# Altium footprint library 4.49-接插件.PcbLib: 260 footprints (part 8 of 17)
Each footprint in its own frame and in the unit in brackets; x right, y up, seen from the top. Pads: shape width x height; smd on the part's side, far side on the other; paste and mask are expansions set on the pad; w line width, h text height; cw(c..) or ccw(c..) is an arc to the next point about the centre after c.
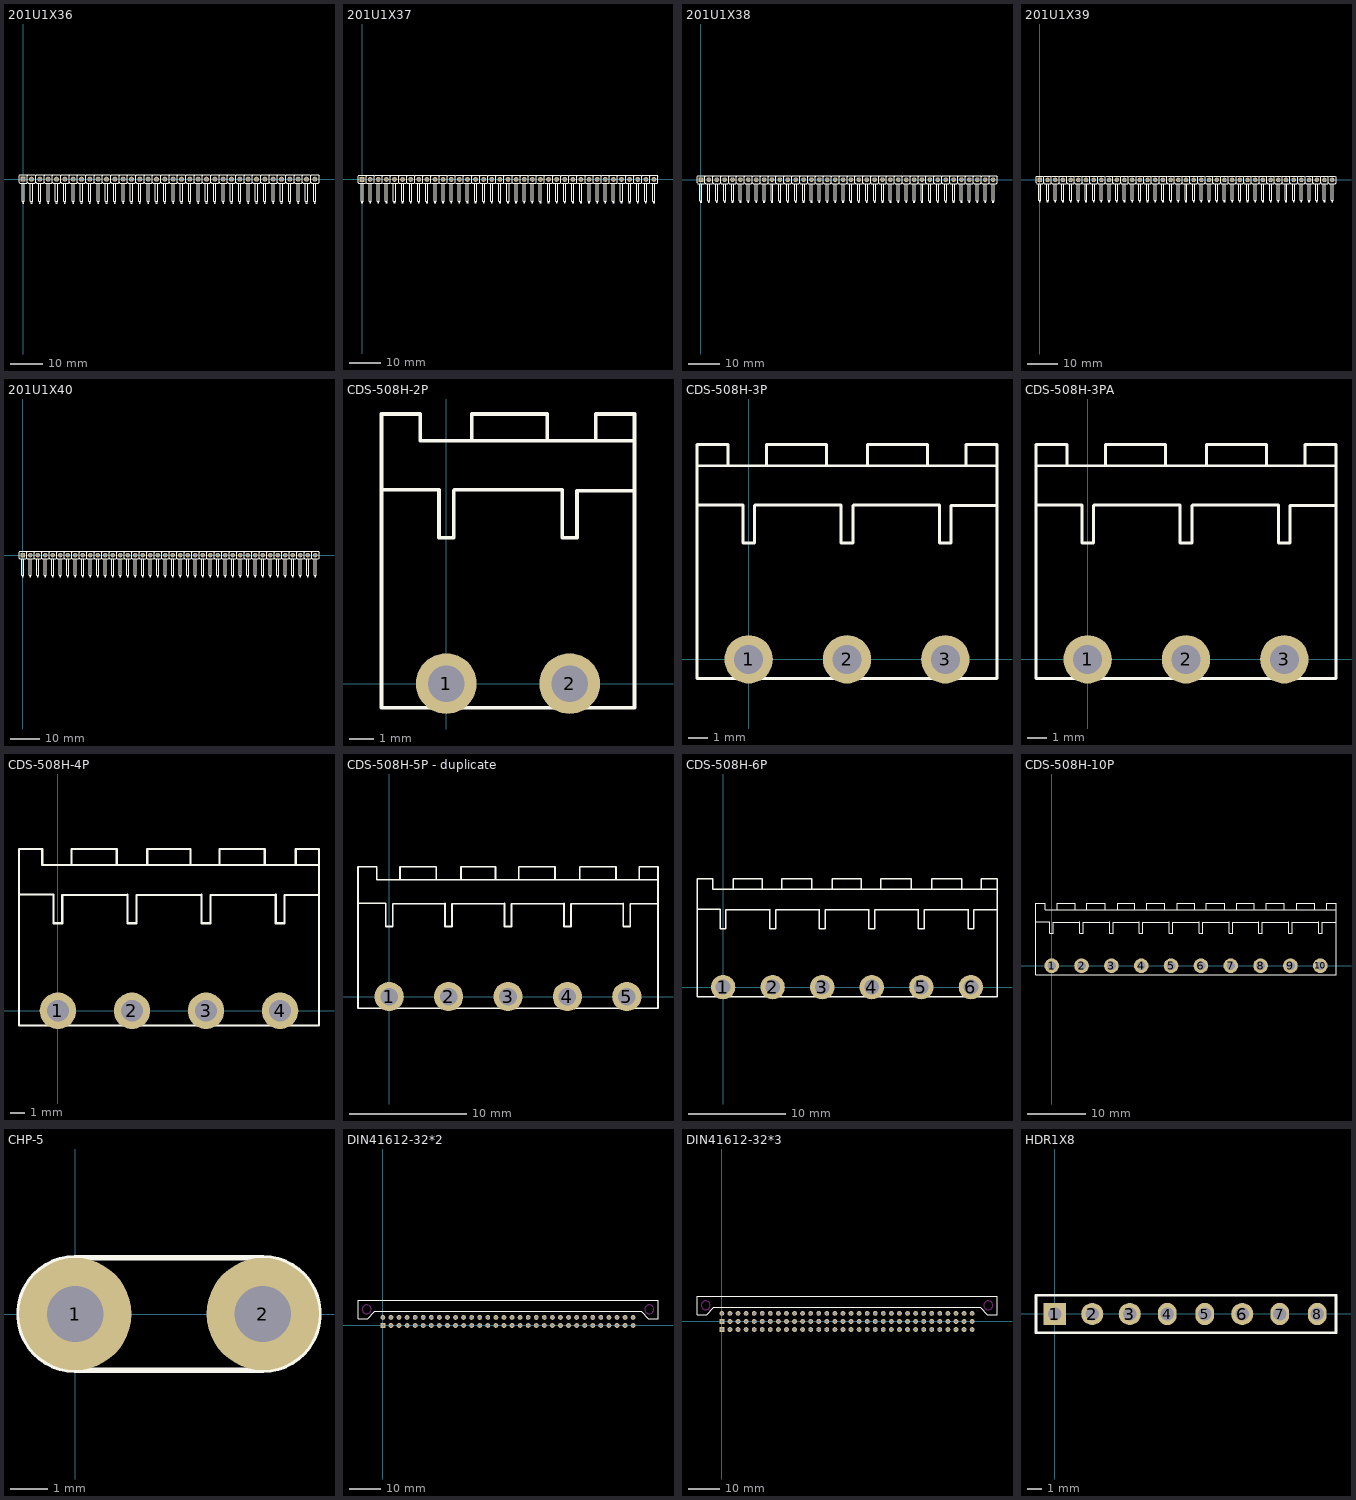
[diagram p7: the footprints below, top view; thin cyan lines are the x and y axes]

## 201U1X36 [mm]
pads (36):
  rect 1.5x1.5 hole 1: 1(0,0)
  round 1.5 hole 1: 2(2.54,0) 3(5.08,0) 4(7.62,0) 5(10.16,0) 6(12.7,0) 7(15.24,0) 8(17.78,0) 9(20.32,0) 10(22.86,0) 11(25.4,0) 12(27.94,0) 13(30.48,0) 14(33.02,0) 15(35.56,0) 16(38.1,0) 17(40.64,0) 18(43.18,0) 19(45.72,0) 20(48.26,0) 21(50.8,0) 22(53.34,0) 23(55.88,0) 24(58.42,0) 25(60.96,0) 26(63.5,0) 27(66.04,0) 28(68.58,0) 29(71.12,0) 30(73.66,0) 31(76.2,0) 32(78.74,0) 33(81.28,0) 34(83.82,0) 35(86.36,0) 36(88.9,0)
Top Overlay:
  drawing of 469 lines, arcs and shapes, not listed
3D body: height 5.12, standoff -3, extent -1.27,-7.27 90.17,1.27

## 201U1X37 [mm]
pads (37):
  rect 1.5x1.5 hole 1: 1(0,0)
  round 1.5 hole 1: 2(2.54,0) 3(5.08,0) 4(7.62,0) 5(10.16,0) 6(12.7,0) 7(15.24,0) 8(17.78,0) 9(20.32,0) 10(22.86,0) 11(25.4,0) 12(27.94,0) 13(30.48,0) 14(33.02,0) 15(35.56,0) 16(38.1,0) 17(40.64,0) 18(43.18,0) 19(45.72,0) 20(48.26,0) 21(50.8,0) 22(53.34,0) 23(55.88,0) 24(58.42,0) 25(60.96,0) 26(63.5,0) 27(66.04,0) 28(68.58,0) 29(71.12,0) 30(73.66,0) 31(76.2,0) 32(78.74,0) 33(81.28,0) 34(83.82,0) 35(86.36,0) 36(88.9,0) 37(91.44,0)
Top Overlay:
  drawing of 482 lines, arcs and shapes, not listed
3D body: height 5.12, standoff -3, extent -1.27,-7.27 92.71,1.27

## 201U1X38 [mm]
pads (38):
  rect 1.5x1.5 hole 1: 1(0,0)
  round 1.5 hole 1: 2(2.54,0) 3(5.08,0) 4(7.62,0) 5(10.16,0) 6(12.7,0) 7(15.24,0) 8(17.78,0) 9(20.32,0) 10(22.86,0) 11(25.4,0) 12(27.94,0) 13(30.48,0) 14(33.02,0) 15(35.56,0) 16(38.1,0) 17(40.64,0) 18(43.18,0) 19(45.72,0) 20(48.26,0) 21(50.8,0) 22(53.34,0) 23(55.88,0) 24(58.42,0) 25(60.96,0) 26(63.5,0) 27(66.04,0) 28(68.58,0) 29(71.12,0) 30(73.66,0) 31(76.2,0) 32(78.74,0) 33(81.28,0) 34(83.82,0) 35(86.36,0) 36(88.9,0) 37(91.44,0) 38(93.98,0)
Top Overlay:
  drawing of 495 lines, arcs and shapes, not listed
3D body: height 5.12, standoff -3, extent -1.27,-7.27 95.25,1.27

## 201U1X39 [mm]
pads (39):
  rect 1.5x1.5 hole 1: 1(0,0)
  round 1.5 hole 1: 2(2.54,0) 3(5.08,0) 4(7.62,0) 5(10.16,0) 6(12.7,0) 7(15.24,0) 8(17.78,0) 9(20.32,0) 10(22.86,0) 11(25.4,0) 12(27.94,0) 13(30.48,0) 14(33.02,0) 15(35.56,0) 16(38.1,0) 17(40.64,0) 18(43.18,0) 19(45.72,0) 20(48.26,0) 21(50.8,0) 22(53.34,0) 23(55.88,0) 24(58.42,0) 25(60.96,0) 26(63.5,0) 27(66.04,0) 28(68.58,0) 29(71.12,0) 30(73.66,0) 31(76.2,0) 32(78.74,0) 33(81.28,0) 34(83.82,0) 35(86.36,0) 36(88.9,0) 37(91.44,0) 38(93.98,0) 39(96.52,0)
Top Overlay:
  drawing of 508 lines, arcs and shapes, not listed
3D body: height 5.12, standoff -3, extent -1.27,-7.27 97.79,1.27

## 201U1X40 [mm]
pads (40):
  rect 1.5x1.5 hole 1: 1(0,0)
  round 1.5 hole 1: 2(2.54,0) 3(5.08,0) 4(7.62,0) 5(10.16,0) 6(12.7,0) 7(15.24,0) 8(17.78,0) 9(20.32,0) 10(22.86,0) 11(25.4,0) 12(27.94,0) 13(30.48,0) 14(33.02,0) 15(35.56,0) 16(38.1,0) 17(40.64,0) 18(43.18,0) 19(45.72,0) 20(48.26,0) 21(50.8,0) 22(53.34,0) 23(55.88,0) 24(58.42,0) 25(60.96,0) 26(63.5,0) 27(66.04,0) 28(68.58,0) 29(71.12,0) 30(73.66,0) 31(76.2,0) 32(78.74,0) 33(81.28,0) 34(83.82,0) 35(86.36,0) 36(88.9,0) 37(91.44,0) 38(93.98,0) 39(96.52,0) 40(99.06,0)
Top Overlay:
  drawing of 521 lines, arcs and shapes, not listed
3D body: height 5.12, standoff -3, extent -1.27,-7.27 100.33,1.27

## CDS-508H-2P [mm]
pads (2):
  round 2.5 hole 1.5: 1(0,0) 2(5.08,0)
Top Overlay:
  lines w0.15: -2.66,7.981 -0.3,7.981 -0.3,6 0.3,6 0.3,7.943 ; 0.338,7.981 4.78,7.981 4.78,6 5.38,6 5.38,7.943 7.719,7.943 ; 1.05,10 1.05,11.1 4.15,11.1 4.15,10 ; 6.15,10 6.15,11.1 7.75,11.1 7.75,-1 -2.67,-1 -2.67,11.1 -1.07,11.1 -1.07,10 7.75,10
3D body: height 8.47, standoff -4, extent -2.46,-1.74 7.54,10.26

## CDS-508H-3P [mm]
pads (3):
  round 2.5 hole 1.5: 1(0,0) 2(5.08,0) 3(10.16,0)
Top Overlay:
  lines w0.15: -2.67,10 12.83,10 ; -2.66,7.981 -0.3,7.981 -0.3,6 0.3,6 0.3,7.943 ; -1.07,10 -1.07,11.1 -2.67,11.1 -2.67,-1 12.83,-1 12.83,11.1 11.23,11.1 11.23,10 ; 0.338,7.981 4.78,7.981 4.78,6 5.38,6 5.38,7.943 ; 0.93,10 0.93,11.1 4.03,11.1 4.03,10 ; 5.418,7.981 9.86,7.981 9.86,6 10.46,6 10.46,7.943 12.799,7.943 ; 6.13,10 6.13,11.1 9.23,11.1 9.23,10
3D body: height 15.6, standoff 0, extent -2.428,1.161 12.588,19.561
3D body: height 8.47, standoff -4, extent -2.46,-1.74 7.54,10.26
3D body: height 8.47, standoff -4, extent 7.66,-1.74 12.66,10.26

## CDS-508H-3PA [mm]
pads (3):
  round 2.5 hole 1.5: 1(0,0) 2(5.08,0) 3(10.16,0)
Top Overlay:
  lines w0.15: -2.67,10 12.83,10 ; -2.66,7.981 -0.3,7.981 -0.3,6 0.3,6 0.3,7.943 ; -1.07,10 -1.07,11.1 -2.67,11.1 -2.67,-1 12.83,-1 12.83,11.1 11.23,11.1 11.23,10 ; 0.338,7.981 4.78,7.981 4.78,6 5.38,6 5.38,7.943 ; 0.93,10 0.93,11.1 4.03,11.1 4.03,10 ; 5.418,7.981 9.86,7.981 9.86,6 10.46,6 10.46,7.943 12.799,7.943 ; 6.13,10 6.13,11.1 9.23,11.1 9.23,10
3D body: height 8.6, standoff -3.5, extent -2.54,-1.74 12.7,10.26

## CDS-508H-4P [mm]
pads (4):
  round 2.5 hole 1.5: 1(0,0) 2(5.08,0) 3(10.16,0) 4(15.24,0)
Top Overlay:
  lines w0.15: -2.659,7.981 -0.3,7.981 -0.3,6 0.3,6 0.3,7.943 4.742,7.943 ; 0.93,10 0.93,11.1 4.03,11.1 4.03,10 ; 4.78,7.981 4.78,6 5.38,6 5.38,7.943 9.822,7.943 ; 6.13,10 6.13,11.1 9.09,11.1 9.09,10 ; 9.86,7.981 9.86,6 10.46,6 10.46,7.943 14.902,7.943 ; 11.09,10 11.09,11.1 14.19,11.1 14.19,10 ; 14.94,7.981 14.94,6 15.54,6 15.54,7.943 17.907,7.943 ; 16.29,10 16.29,11.1 17.91,11.1 ; 16.31,10 16.31,11.1 17.91,11.1 ; 17.91,10 -1.07,10 -1.07,11.1 -2.67,11.1 -2.67,-1 17.91,-1 17.91,11.1
3D body: height 8.47, standoff -4, extent -2.46,-1.74 7.54,10.26
3D body: height 8.47, standoff -4, extent 7.66,-1.74 17.66,10.26
3D body: height 12.8, standoff 0.3, extent -2.54,1.899 17.78,19.299

## CDS-508H-5P - duplicate [mm]
pads (5):
  round 2.5 hole 1.5: 1(0,0) 2(5.08,0) 3(10.16,0) 4(15.24,0) 5(20.32,0)
Top Overlay:
  lines w0.15: -2.659,7.981 -0.3,7.981 -0.3,6 0.3,6 0.3,7.943 4.742,7.943 ; 0.93,10 0.93,11.1 4.03,11.1 4.03,10 ; 4.78,7.981 4.78,6 5.38,6 5.38,7.943 9.822,7.943 ; 6.13,10 6.13,11.1 9.09,11.1 9.09,10 ; 9.86,7.981 9.86,6 10.46,6 10.46,7.943 14.902,7.943 ; 11.09,10 11.09,11.1 14.19,11.1 14.19,10 ; 14.94,7.981 14.94,6 15.54,6 15.54,7.943 19.982,7.943 ; 16.29,10 16.29,11.1 19.39,11.1 19.39,10 ; 20.02,7.981 20.02,6 20.62,6 20.62,7.943 22.98,7.943 ; 21.39,10 21.39,11.1 22.99,11.1 22.99,-1 -2.67,-1 -2.67,11.1 -1.07,11.1 -1.07,10 22.99,10
3D body: height 8.47, standoff -4, extent 12.78,-1.74 22.78,10.26
3D body: height 8.47, standoff -4, extent -2.46,-1.74 7.54,10.26
3D body: height 8.47, standoff -4, extent 7.66,-1.74 12.66,10.26

## CDS-508H-6P [mm]
pads (6):
  round 2.5 hole 1.5: 1(0,0) 2(5.08,0) 3(10.16,0) 4(15.24,0) 5(20.32,0) 6(25.4,0)
Top Overlay:
  lines w0.15: -2.659,7.981 -0.3,7.981 -0.3,6 0.3,6 0.3,7.943 4.742,7.943 ; 1.05,10 1.05,11.1 4.01,11.1 4.01,10 ; 4.78,7.981 4.78,6 5.38,6 5.38,7.943 9.822,7.943 ; 6.01,10 6.01,11.1 9.11,11.1 9.11,10 ; 9.86,7.981 9.86,6 10.46,6 10.46,7.943 14.902,7.943 ; 11.21,10 11.21,11.1 14.17,11.1 14.17,10 ; 14.94,7.981 14.94,6 15.54,6 15.54,7.943 19.982,7.943 ; 16.17,10 16.17,11.1 19.27,11.1 19.27,10 ; 20.02,7.981 20.02,6 20.62,6 20.62,7.943 25.062,7.943 ; 21.37,10 21.37,11.1 24.47,11.1 24.47,10 ; 25.1,7.981 25.1,6 25.7,6 25.7,7.943 28.06,7.943 ; 26.47,10 26.47,11.1 28.07,11.1 28.07,-1 -2.67,-1 -2.67,11.1 -1.07,11.1 -1.07,10 28.07,10
3D body: height 8.47, standoff -4, extent -2.46,-1.74 7.54,10.26
3D body: height 8.47, standoff -4, extent 7.7,-1.74 17.7,10.26
3D body: height 8.47, standoff -4, extent 17.86,-1.74 27.86,10.26

## CDS-508H-10P [mm]
pads (10):
  round 2.5 hole 1.5: 1(0,0) 2(5.08,0) 3(10.16,0) 4(15.24,0) 5(20.32,0) 6(25.4,0) 7(30.48,0) 8(35.56,0) 9(40.64,0) 10(45.72,0)
Top Overlay:
  lines w0.15: -2.659,7.481 -0.3,7.481 -0.3,5.5 0.3,5.5 0.3,7.443 4.742,7.443 ; 0.93,9.5 0.93,10.6 4.01,10.6 4.01,9.5 ; 4.78,7.481 4.78,5.5 5.38,5.5 5.38,7.443 9.822,7.443 ; 6.01,9.5 6.01,10.6 9.11,10.6 9.11,9.5 ; 9.86,7.481 9.86,5.5 10.46,5.5 10.46,7.443 14.902,7.443 ; 11.21,9.5 11.21,10.6 14.17,10.6 14.17,9.5 ; 14.94,7.481 14.94,5.5 15.54,5.5 15.54,7.443 19.982,7.443 ; 16.17,9.5 16.17,10.6 19.27,10.6 19.27,9.5 ; 20.02,7.481 20.02,5.5 20.62,5.5 20.62,7.443 25.062,7.443 ; 21.37,9.5 21.37,10.6 24.33,10.6 24.33,9.5 ; 25.1,7.481 25.1,5.5 25.7,5.5 25.7,7.443 30.142,7.443 ; 26.33,9.5 26.33,10.6 29.43,10.6 29.43,9.5 ; 30.18,7.481 30.18,5.5 30.78,5.5 30.78,7.443 35.222,7.443 ; 31.53,9.5 31.53,10.6 34.49,10.6 34.49,9.5 ; 35.26,7.481 35.26,5.5 35.86,5.5 35.86,7.443 40.302,7.443 ; 36.49,9.5 36.49,10.6 39.59,10.6 39.59,9.5 ; 40.34,7.481 40.34,5.5 40.94,5.5 40.94,7.443 45.382,7.443 ; 41.69,9.5 41.69,10.6 44.79,10.6 44.79,9.5 ; 45.42,7.481 45.42,5.5 46.02,5.5 46.02,7.443 48.38,7.443 ; 46.79,9.5 46.79,10.6 48.39,10.6 48.39,-1.5 -2.67,-1.5 -2.67,10.6 -1.07,10.6 -1.07,9.5 48.39,9.5
3D body: height 7.87, standoff -3.1, extent -2.667,-1.482 48.387,10.456

## CHP-5 [mm]
pads (2):
  round 3 hole 1.5: 1(0,0) 2(5,0)
Top Overlay:
  lines w0.15: 0,-1.5 cw(c0,0) 0,1.5 5,1.5 cw(c5,0) 5,-1.5 0,-1.5
3D body: height 10.22, standoff -3.8, extent -1.46,-1.545 6.46,1.545

## DIN41612-32*2 [mm]
pads (64):
  rect 1.5x1.5 hole 1: 1(0,0)
  round 1.5 hole 1: 2(0,2.54) 3(2.54,0) 4(2.54,2.54) 5(5.08,0) 6(5.08,2.54) 7(7.62,0) 8(7.62,2.54) 9(10.16,0) 10(10.16,2.54) 11(12.7,0) 12(12.7,2.54) 13(15.24,0) 14(15.24,2.54) 15(17.78,0) 16(17.78,2.54) 17(20.32,0) 18(20.32,2.54) 19(22.86,0) 20(22.86,2.54) 21(25.4,0) 22(25.4,2.54) 23(27.94,0) 24(27.94,2.54) 25(30.48,0) 26(30.48,2.54) 27(33.02,0) 28(33.02,2.54) 29(35.56,0) 30(35.56,2.54) 31(38.1,0) 32(38.1,2.54) 33(40.64,0) 34(40.64,2.54) 35(43.18,0) 36(43.18,2.54) 37(45.72,0) 38(45.72,2.54) 39(48.26,0) 40(48.26,2.54) 41(50.8,0) 42(50.8,2.54) 43(53.34,0) 44(53.34,2.54) 45(55.88,0) 46(55.88,2.54) 47(58.42,0) 48(58.42,2.54) 49(60.96,0) 50(60.96,2.54) 51(63.5,0) 52(63.5,2.54) 53(66.04,0) 54(66.04,2.54) 55(68.58,0) 56(68.58,2.54) 57(71.12,0) 58(71.12,2.54) 59(73.66,0) 60(73.66,2.54) 61(76.2,0) 62(76.2,2.54) 63(78.74,0) 64(78.74,2.54)
Top Overlay:
  lines w0.15: -7.83,2.18 -4.83,2.18 -2.525,4.485 81.265,4.485 83.57,2.18 86.57,2.18 86.57,7.98 -7.83,7.98 -7.83,2.18
Keep-Out Layer:
  circle w0.1: c-5.085,5.08 r1.4
  circle w0.1: c83.825,5.08 r1.4
3D body: height 6.95, standoff -2.9, extent -7.63,-0.242 86.37,15.188

## DIN41612-32*3 [mm]
pads (96):
  round 1.5 hole 1: A1(0,2.54) A2(2.54,2.54) A3(5.08,2.54) A4(7.62,2.54) A5(10.16,2.54) A6(12.7,2.54) A7(15.24,2.54) A8(17.78,2.54) A9(20.32,2.54) A10(22.86,2.54) A11(25.4,2.54) A12(27.94,2.54) A13(30.48,2.54) A14(33.02,2.54) A15(35.56,2.54) A16(38.1,2.54) A17(40.64,2.54) A18(43.18,2.54) A19(45.72,2.54) A20(48.26,2.54) A21(50.8,2.54) A22(53.34,2.54) A23(55.88,2.54) A24(58.42,2.54) A25(60.96,2.54) A26(63.5,2.54) A27(66.04,2.54) A28(68.58,2.54) A29(71.12,2.54) A30(73.66,2.54) A31(76.2,2.54) A32(78.74,2.54) B2(2.54,0) B3(5.08,0) B4(7.62,0) B5(10.16,0) B6(12.7,0) B7(15.24,0) B8(17.78,0) B9(20.32,0) B10(22.86,0) B11(25.4,0) B12(27.94,0) B13(30.48,0) B14(33.02,0) B15(35.56,0) B16(38.1,0) B17(40.64,0) B18(43.18,0) B19(45.72,0) B20(48.26,0) B21(50.8,0) B22(53.34,0) B23(55.88,0) B24(58.42,0) B25(60.96,0) B26(63.5,0) B27(66.04,0) B28(68.58,0) B29(71.12,0) B30(73.66,0) B31(76.2,0) B32(78.74,0) C2(2.54,-2.54) C3(5.08,-2.54) C4(7.62,-2.54) C5(10.16,-2.54) C6(12.7,-2.54) C7(15.24,-2.54) C8(17.78,-2.54) C9(20.32,-2.54) C10(22.86,-2.54) C11(25.4,-2.54) C12(27.94,-2.54) C13(30.48,-2.54) C14(33.02,-2.54) C15(35.56,-2.54) C16(38.1,-2.54) C17(40.64,-2.54) C18(43.18,-2.54) C19(45.72,-2.54) C20(48.26,-2.54) C21(50.8,-2.54) C22(53.34,-2.54) C23(55.88,-2.54) C24(58.42,-2.54) C25(60.96,-2.54) C26(63.5,-2.54) C27(66.04,-2.54) C28(68.58,-2.54) C29(71.12,-2.54) C30(73.66,-2.54) C31(76.2,-2.54) C32(78.74,-2.54)
  rect 1.5x1.5 hole 1: B1(0,0) C1(0,-2.54)
Top Overlay:
  lines w0.15: -7.83,2.18 -4.83,2.18 -2.525,4.485 81.265,4.485 83.57,2.18 86.57,2.18 86.57,7.98 -7.83,7.98 -7.83,2.18
Keep-Out Layer:
  circle w0.1: c-5.085,5.08 r1.4
  circle w0.1: c83.825,5.08 r1.4
3D body: height 9.36, standoff -2.72, extent -7.63,-2.834 86.37,15.188
3D body: height 9.07, standoff -1.53, extent -8.08,8.602 86.82,25.022

## HDR1X8 [mm] "Connector; Header; 8 Position"
pads (8):
  rect 1.5x1.5 hole 0.9: 1(0,0)
  round 1.5 hole 0.9: 2(2.54,0) 3(5.08,0) 6(12.7,0)
  oval 1.27x1.5 hole 0.9: 4(7.62,0) 5(10.16,0) 7(15.24,0) 8(17.78,0)
Top Overlay:
  lines w0.2: -1.27,-1.27 19.05,-1.27 19.05,1.27 -1.27,1.27 -1.27,-1.27
3D body: height 0.7, standoff -10.9, extent -1.27,-1.27 19.05,1.27